# Altium footprint library Cty1.PcbLib: 870 footprints (part 44 of 55)
Each footprint in its own frame and in the unit in brackets; x right, y up, seen from the top. Pads: shape width x height; smd on the part's side, far side on the other; paste and mask are expansions set on the pad; w line width, h text height; cw(c..) or ccw(c..) is an arc to the next point about the centre after c.
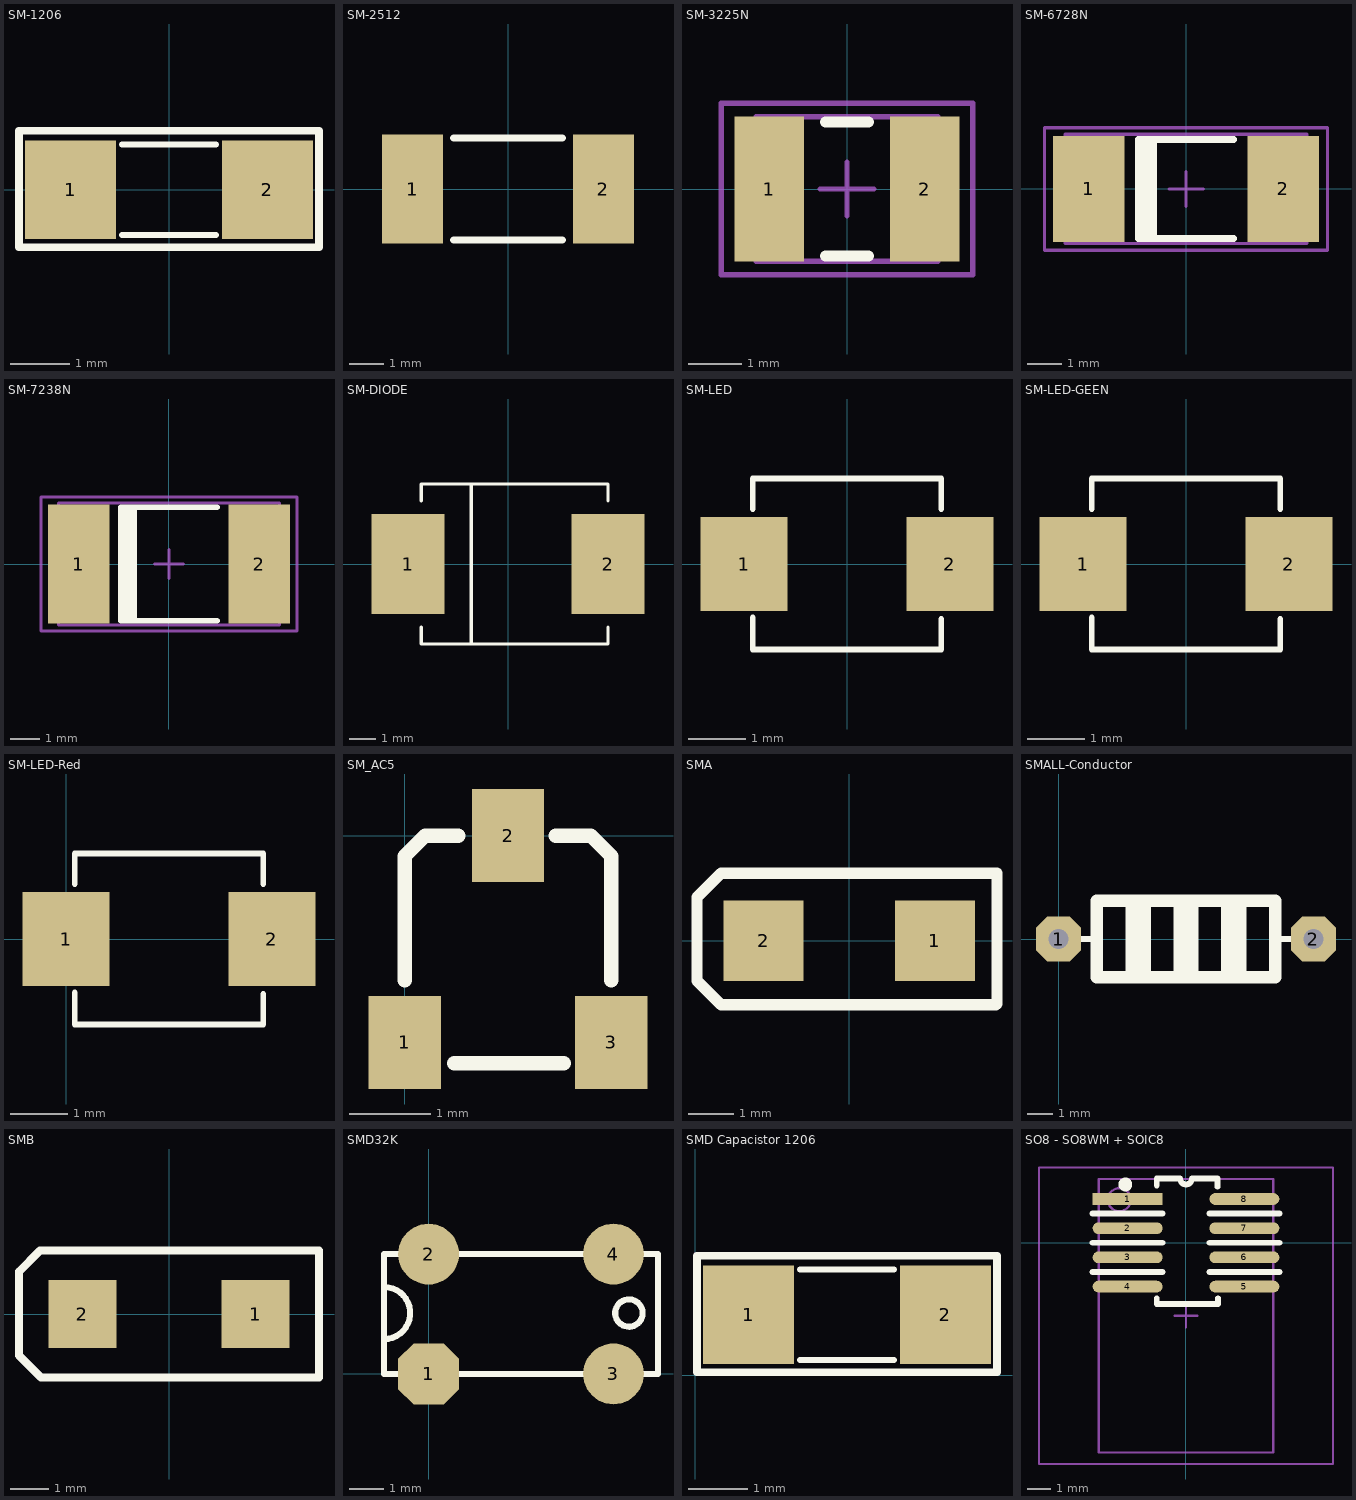
[diagram p43: the footprints below, top view; thin cyan lines are the x and y axes]

## SM-1206 [mil] "Compoment SMD 120x60mil"
height 50
pads (2):
  rect 60x65 smd: 1(-65,0) 2(65,0)
Top Overlay:
  lines w4: -31,-30 31,-30 ; -31,30 31,30
  lines w5: -99,-38 99,-38 99,39 -99,39 -99,-38
3D body "User Library-res1206.STEP": height 24.79, standoff 0, extent -82.68,-35 82.68,35.87

## SM-2512 [mm] "Chip Resistor; Body 6.3 x 3.2 mm (LxW typ) - C"
height 0.6
pads (2):
  rect 1.8x3.2 smd: 1(-2.8,0) 2(2.8,0)
Top Overlay:
  lines w0.2: -1.6,-1.5 1.6,-1.5 ; -1.6,1.5 1.6,1.5

## SM-3225N [mm] "Chip Capacitor, Body 3.2x2.5mm, IPC Medium Density"
height 1.35
pads (2):
  rect 1.3x2.7 smd: 1(-1.45,0) 2(1.45,0)
Top Overlay:
  lines w0.2: -0.4,-1.25 0.4,-1.25 ; -0.4,1.25 0.4,1.25
Mechanical 13:
  lines w0.1: -1.7,-1.35 1.7,-1.35 1.7,1.35 -1.7,1.35 -1.7,-1.35
Mechanical 15:
  lines w0.1: -0.5,0 0.5,0 ; 0,-0.5 0,0.5 ; -2.35,-1.6 2.35,-1.6 2.35,1.6 -2.35,1.6 -2.35,-1.6
3D body: height 1.35, standoff 0, extent -1.7,-1.35 1.7,1.35

## SM-6728N [mm] "Chip Capacitor, Body 6.7x2.8mm, IPC Medium Density"
height 3.18
pads (2):
  rect 2.1x3.1 smd: 1(-2.85,0) 2(2.85,0)
Top Overlay:
  rectangle: -1.4,-1.45 -0.85,1.45
  lines w0.2: 1.4,-1.45 -1.4,-1.45 -1.4,1.45 1.4,1.45
Mechanical 13:
  lines w0.1: -3.55,-1.6 3.55,-1.6 3.55,1.6 -3.55,1.6 -3.55,-1.6
Mechanical 15:
  lines w0.1: -0.5,0 0.5,0 ; 0,-0.5 0,0.5 ; -4.15,-1.8 4.15,-1.8 4.15,1.8 -4.15,1.8 -4.15,-1.8
3D body: height 3.18, standoff 0, extent -3.55,-1.6 3.55,1.6

## SM-7238N [mm] "Chip Capacitor, Body 7.2x3.8mm, IPC Medium Density"
height 3.18
pads (2):
  rect 2.1x4.1 smd: 1(-3.1,0) 2(3.1,0)
Top Overlay:
  rectangle: -1.65,-1.95 -1.1,1.95
  lines w0.2: 1.65,-1.95 -1.65,-1.95 -1.65,1.95 1.65,1.95
Mechanical 13:
  lines w0.1: -3.8,-2.1 -3.8,2.1 3.8,2.1 3.8,-2.1 -3.8,-2.1
Mechanical 15:
  lines w0.1: -0.5,0 0.5,0 ; 0,-0.5 0,0.5 ; -4.4,-2.3 -4.4,2.3 4.4,2.3 4.4,-2.3 -4.4,-2.3
3D body: height 3.18, standoff 0, extent -3.8,-2.1 3.8,2.1

## SM-DIODE [mil] "Magnetic-Core Inductor with Winding Polarity Marking; 2 Leads"
pads (2):
  rect 110x150 smd: 1(-150,0) 2(150,0)
Top Overlay:
  lines w5: -130,-95 -130,-120 150,-120 150,-95 ; -130,95 -130,120 150,120 150,95 ; -55,-120 -55,120
Mechanical 1:
  lines w1: -130,-120 150,-120 ; -130,120 150,120
3D body "SW3DPS-DIOD SMD 10BF10-DEFAULT.STEP": height 96.27, standoff 0.6, extent -103.33,-72.86 105.33,68.87

## SM-LED [mil] "Compoment SMD 120x60mil"
height 50
pads (2):
  rect 60x65 smd: 1(-71,0) 2(71,0)
Top Overlay:
  lines w4: -65,-37 -65,-59 65,-59 65,-38 ; -65,38 -65,59 65,59 65,38

## SM-LED-GEEN [mil] "Compoment SMD 120x60mil"
height 50
pads (2):
  rect 60x65 smd: 1(-71,0) 2(71,0)
Top Overlay:
  lines w4: -65,-37 -65,-59 65,-59 65,-38 ; -65,38 -65,59 65,59 65,38
3D body "SW3dPS-LED1206G.STEP": height 43.81, standoff -15.9, extent -63,-32 63,31

## SM-LED-Red [mil]
pads (2):
  rect 60x65 smd: 1(0,0) 2(142,0)
Top Overlay:
  lines w4: 6,-37 6,-59 136,-59 136,-38 ; 6,38 6,59 136,59 136,38
3D body "SW3dPS-LED1206G.STEP": height 43.81, standoff -15.9, extent 10,-32 136,31

## SM_AC5 [mil]
pads (3):
  rect 35x45 smd: 1(0,-100) 2(50,0) 3(100,-100)
Top Overlay:
  lines w7: 0,-70 0,-10 10,0 26,0 ; 24,-110 77,-110 ; 73,0 90,0 100,-10 100,-70

## SMA [mil]
pads (2):
  rect 70x70 smd: 1(74.8,0) 2(-74.8,0)
Top Overlay:
  lines w10: -133,-35 -133,38 -112,59 -106,59 129,59 129,-55 128,-56 -111,-56 -112,-56 -133,-35

## SMALL-Conductor [mm] "Small value conductor"
pads (2):
  oct 1.8x1.8 hole 0.8: 1(0,0) 2(10.16,0)
Top Overlay:
  rectangle: 6.477,-1.524 7.493,1.524
  rectangle: 2.667,-1.524 3.683,1.524
  rectangle: 4.572,-1.524 5.588,1.524
  lines w0.254: 0,0 1.524,0 ; 8.89,0 10.16,0
  lines w0.5: 1.524,-1.524 1.524,1.524 8.636,1.524 8.636,-1.524 1.524,-1.524

## SMB [mil]
pads (2):
  rect 70x70 smd: 1(88.58,0) 2(-88.58,0)
Top Overlay:
  lines w7.87: -153.54,-42.46 -153.54,0 -153.54,43.46 -132.04,64.96 153.54,64.96 153.54,-64.96 -131.04,-64.96 -153.54,-42.46

## SMD32K [mil]
pads (4):
  oct 70x70 smd: 1(0,0)
  round 70 smd: 2(0,137.8) 3(212.6,0) 4(212.6,137.8)
Top Overlay:
  circle w7: c230.31,70 r15.75
  lines w7: -51.18,40 ccw(c-51.18,70) -51.18,100 ; -27.56,0 -51.18,0 -51.18,137.8 -27.56,137.8 ; 27.56,0 185.04,0 ; 27.56,137.8 185.04,137.8 ; 240.16,0 263.78,0 263.78,137.8 240.16,137.8

## SMD Capacistor 1206 [mil]
pads (2):
  rect 60x65 smd: 1(35,40) 2(165,40)
Top Overlay:
  lines w4: 69,10 131,10 ; 69,70 131,70
  lines w5: 1,2 1,79 199,79 199,2 1,2
3D body "SW3dPS-smt_resistor_packages.STEP": height 24.02, standoff -0.39, extent 60.24,15 139.76,65

## SO8 - SO8WM + SOIC8 [mil] "SO, 14-Leads, Body 10x3.8mm, Pitch 1.27mm"
height 104.33
pads (8):
  rect 120x20 smd: 1(-100,75)
  oval 120x20 smd: 2(-100,25) 3(-100,-25) 4(-100,-75) 5(100,-75) 6(100,-25) 7(100,25) 8(100,75)
Top Overlay:
  circle w15.75: c-103.94,100 r3.94
  lines w10: -160,-50 -40,-50 ; -160,0 -40,0 ; -160,50 -40,50 ; -50,-95 -50,-105 55,-105 55,-95 ; -50,98 -50,110 -10,110 ccw(c0,110) 10,110 54,110 54,106.5 54,99.5 54,96 ; 40,-50 160,-50 ; 40,0 160,0 ; 40,50 160,50
Mechanical 13:
  circle w3.94: c-114.17,73.82 r19.68
  lines w3.94: -149.61,-359.25 149.61,-359.25 149.61,109.25 -149.61,109.25 -149.61,-359.25
Mechanical 15:
  lines w3.94: -19.68,-125 19.69,-125 ; 0,-144.69 0,-105.31 ; -251.97,-378.94 251.97,-378.94 251.97,128.94 -251.97,128.94 -251.97,-378.94